# Altium footprint library LDCN Components.PcbLib: 426 footprints (part 18 of 27)
Each footprint in its own frame and in the unit in brackets; x right, y up, seen from the top. Pads: shape width x height; smd on the part's side, far side on the other; paste and mask are expansions set on the pad; w line width, h text height; cw(c..) or ccw(c..) is an arc to the next point about the centre after c.
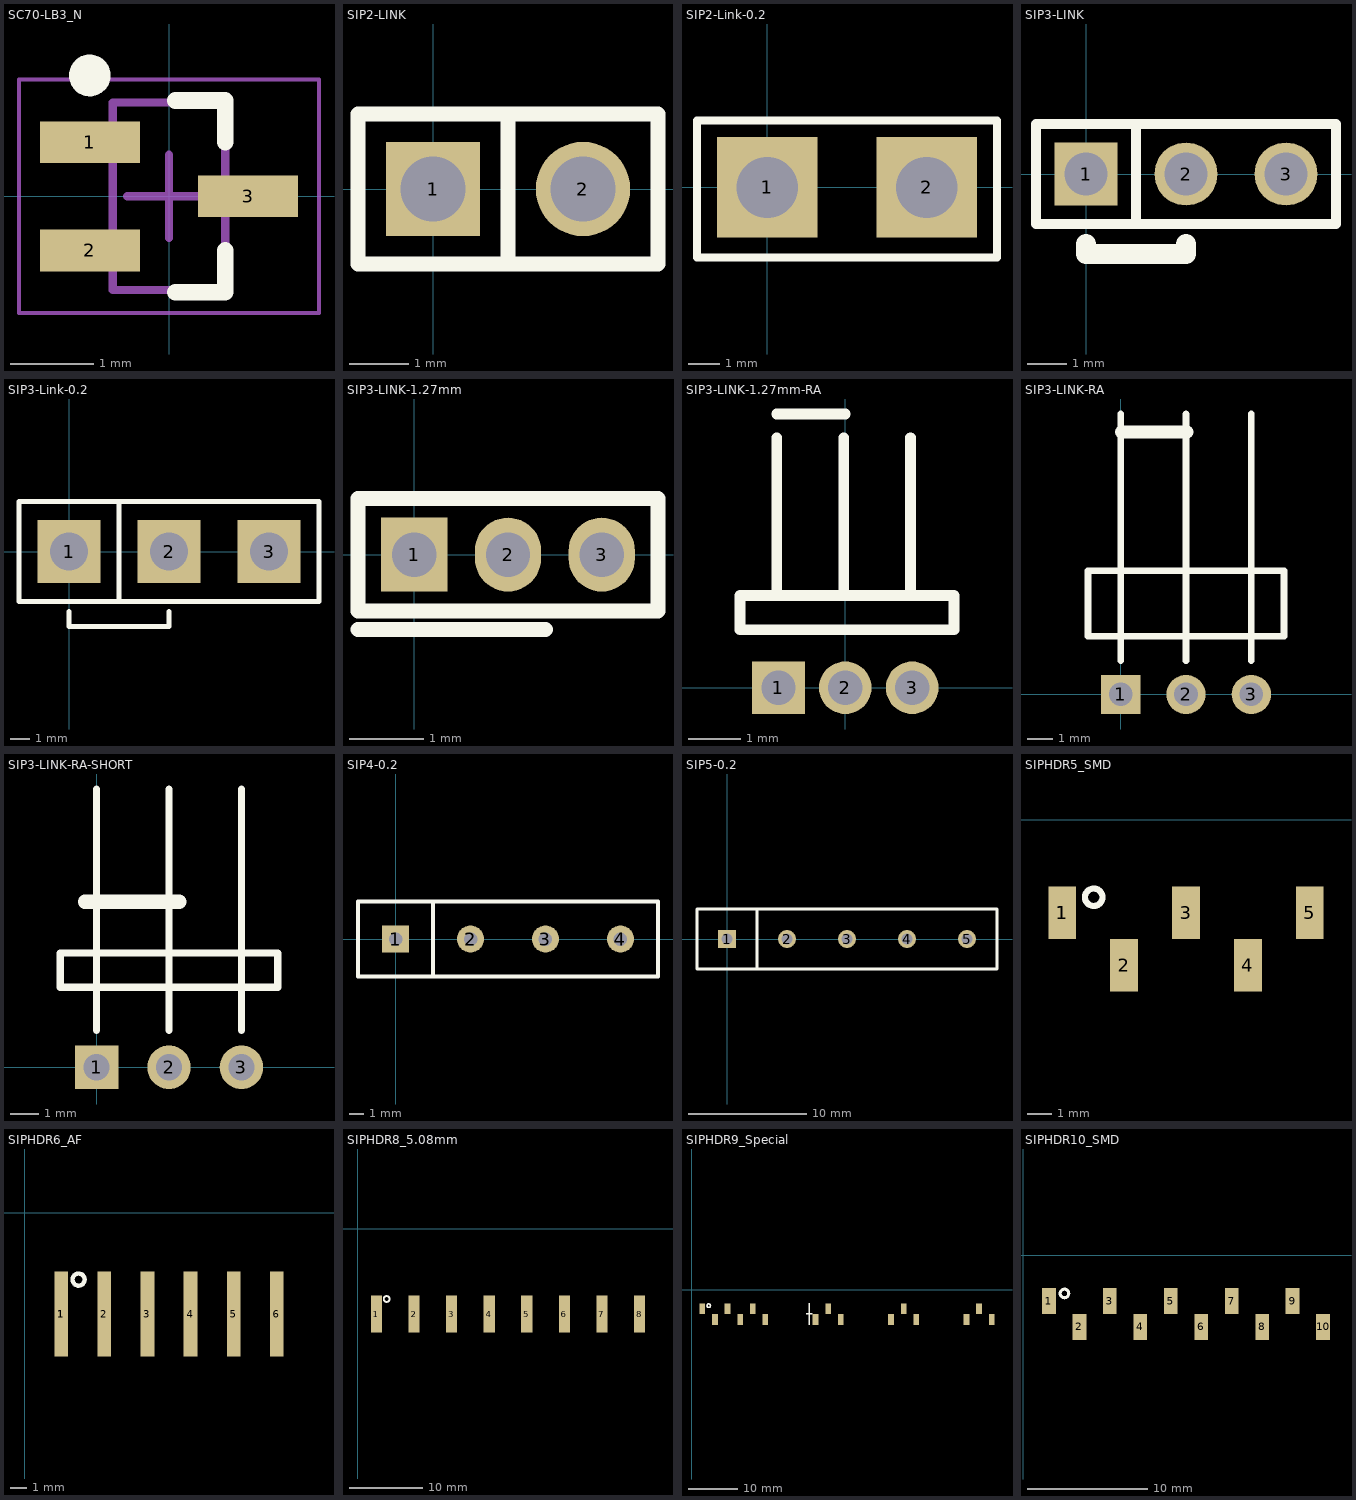
[diagram p17: the footprints below, top view; thin cyan lines are the x and y axes]

## SC70-LB3_N [mm]
pads (3):
  rect 1.2x0.5 smd: 1(-0.95,0.65) 2(-0.95,-0.65) 3(0.95,0)
Top Overlay:
  circle w0.25: c-0.95,1.45 r0.125
  lines w0.2: 0.075,-1.15 0.675,-1.15 0.675,-0.65 ; 0.075,1.15 0.675,1.15 0.675,0.65
Mechanical 13:
  lines w0.1: -0.675,-1.125 -0.675,1.125 0.675,1.125 0.675,-1.125 -0.675,-1.125
Mechanical 15:
  lines w0.05: -1.8,-1.4 -1.8,1.4 1.8,1.4 1.8,-1.4 -1.8,-1.4
  lines w0.1: -0.5,0 0.5,0 ; 0,-0.5 0,0.5
3D body: height 1.1, standoff 0, extent -0.675,-1.125 0.675,1.125

## SIP2-LINK [mm]
pads (2):
  rect 1.6x1.6 hole 1.1: 1(0,0)
  round 1.6 hole 1.1: 2(2.54,0)
Top Overlay:
  lines w0.254: 1.27,-1.27 1.27,1.27 ; -1.27,-1.27 -1.27,1.27 3.81,1.27 3.81,-1.27 -1.27,-1.27

## SIP2-Link-0.2 [mm] "Socket for 0.2in shorting plug"
height 10
pads (2):
  rect 3.2x3.2 hole 1.95: 1(0,0) 2(5.08,0)
Top Overlay:
  lines w0.254: -2.24,-2.24 -2.24,2.14 7.32,2.14 7.32,-2.24 -2.24,-2.24

## SIP3-LINK [mm]
pads (3):
  rect 1.6x1.6 hole 1.1: 1(0,0)
  round 1.6 hole 1.1: 2(2.54,0) 3(5.08,0)
Top Overlay:
  lines w0.254: 1.27,-1.27 1.27,1.27 ; -1.27,-1.27 -1.27,1.27 6.35,1.27 6.35,-1.27 -1.27,-1.27
  lines w0.508: 0,-1.778 0,-2.032 2.54,-2.032 2.54,-1.778

## SIP3-Link-0.2 [mm] "Socket for 0.2in shorting plug"
height 10
pads (3):
  rect 3.2x3.2 hole 1.95: 1(0,0) 2(5.08,0) 3(10.16,0)
Top Overlay:
  lines w0.254: 0,-3.048 0,-3.81 5.08,-3.81 5.08,-3.048 ; 2.54,-2.54 2.54,2.54 ; -2.54,-2.54 12.7,-2.54 12.7,2.54 -2.54,2.54 -2.54,-2.54

## SIP3-LINK-1.27mm [mm]
pads (3):
  rect 0.9x1 hole 0.6: 1(0,0)
  oval 0.9x1 hole 0.6: 2(1.27,0) 3(2.54,0)
Top Overlay:
  lines w0.203: -0.762,-1.016 1.778,-1.016 ; -0.762,-0.762 -0.762,0.762 3.302,0.762 3.302,-0.762 -0.762,-0.762

## SIP3-LINK-1.27mm-RA [mm]
pads (3):
  rect 1x1 hole 0.65: 1(-1.27,0)
  round 1 hole 0.65: 2(0,0) 3(1.27,0)
Top Overlay:
  lines w0.203: -2,1.724 -2,1.1 2.064,1.1 2.064,1.75 -2,1.75 ; -1.3,1.75 -1.3,4.75 ; -1.3,5.2 0,5.2 ; -0.03,1.75 -0.03,4.75 ; 1.24,1.75 1.24,4.75

## SIP3-LINK-RA [mil]
pads (3):
  rect 60x60 hole 36: 1(0,0)
  round 60 hole 36: 2(100,0) 3(200,0)
Top Overlay:
  lines w10: 0,51.18 0,188.98 0,429.13 ; 100,51.18 100,188.98 100,429.13 ; 200,51.18 200,188.98 200,429.13 ; -50,88.98 250,88.98 250,188.98 -50,188.98 -50,88.98
  lines w20: 1.18,401.57 101.18,401.57

## SIP3-LINK-RA-SHORT [mil]
pads (3):
  rect 60x60 hole 36: 1(0,0)
  round 60 hole 36: 2(100,0) 3(200,0)
Top Overlay:
  lines w10: 0,51.18 0,383.86 ; 100,51.18 100,383.86 ; 200,51.18 200,383.86 ; -50,110.24 -50,157.48 250,157.48 250,110.24 -50,110.24
  lines w19.68: -15.75,228.35 114.17,228.35

## SIP4-0.2 [mil]
height 393.7
pads (4):
  rect 72x72 hole 36: 1(0,0)
  round 72 hole 36: 2(200,0) 3(400,0) 4(600,0)
Top Overlay:
  lines w10: 100,-100 100,100 ; -100,-100 -100,100 700,100 700,-100 -100,-100

## SIP5-0.2 [mil]
height 393.7
pads (5):
  rect 60x60 hole 36: 1(0,0)
  round 60 hole 36: 2(200,0) 3(400,0) 4(600,0)
  round 60 hole 35.98: 5(800,0)
Top Overlay:
  lines w10: 100,-100 100,100 ; -100,-100 -100,100 900,100 900,-100 -100,-100

## SIPHDR5_SMD [mil]
height 196.85
pads (6):
  rect 45x85 smd: 1(85,-150) 1(85,-150) 2(185,-235) 3(285,-150) 4(385,-235) 5(485,-150)
Top Overlay:
  circle w10: c135.86,-125 r14.14

## SIPHDR6_AF [mm] "Pads for SM of 2.54mm straight connector"
pads (7):
  rect 0.8x5 smd: 1(2.159,-5.969) 1(2.159,-5.969) 2(4.699,-5.969) 3(7.239,-5.969) 4(9.779,-5.969) 5(12.319,-5.969) 6(14.859,-5.969)
Top Overlay:
  circle w0.254: c3.175,-3.937 r0.359

## SIPHDR8_5.08mm [mm]
pads (8):
  rect 1.5x5 smd: 1(2.54,-11.557) 2(7.62,-11.557) 3(12.7,-11.557) 4(17.78,-11.557) 5(22.86,-11.557) 6(27.94,-11.557) 7(33.02,-11.557) 8(38.1,-11.557)
Top Overlay:
  circle w0.254: c3.916,-9.525 r0.402

## SIPHDR9_Special [mil]
height 196.85
pads (15):
  rect 45x85 smd: 1(85,-150) 2(185,-235) 3(285,-150) 4(385,-235) 5(485,-150) 6(585,-235) 7(985,-235) 8(1085,-150) 9(1185,-235) 10(1585,-235) 11(1685,-150) 12(1785,-235) 13(2185,-235) 14(2285,-150) 15(2385,-235)
Top Overlay:
  circle w10: c135.86,-125 r14.14
  lines w10: 910,-190 960,-190 ; 935,-275 935,-105

## SIPHDR10_SMD [mil]
height 196.85
pads (10):
  rect 45x85 smd: 1(85,-150) 2(185,-235) 3(285,-150) 4(385,-235) 5(485,-150) 6(585,-235) 7(685,-150) 8(785,-235) 9(885,-150) 10(985,-235)
Top Overlay:
  circle w10: c135.86,-125 r14.14